# Altium footprint library chipfc_extras_footprint.PCBLIB: 89 footprints (part 5 of 6)
Each footprint in its own frame and in the unit in brackets; x right, y up, seen from the top. Pads: shape width x height; smd on the part's side, far side on the other; paste and mask are expansions set on the pad; w line width, h text height; cw(c..) or ccw(c..) is an arc to the next point about the centre after c.
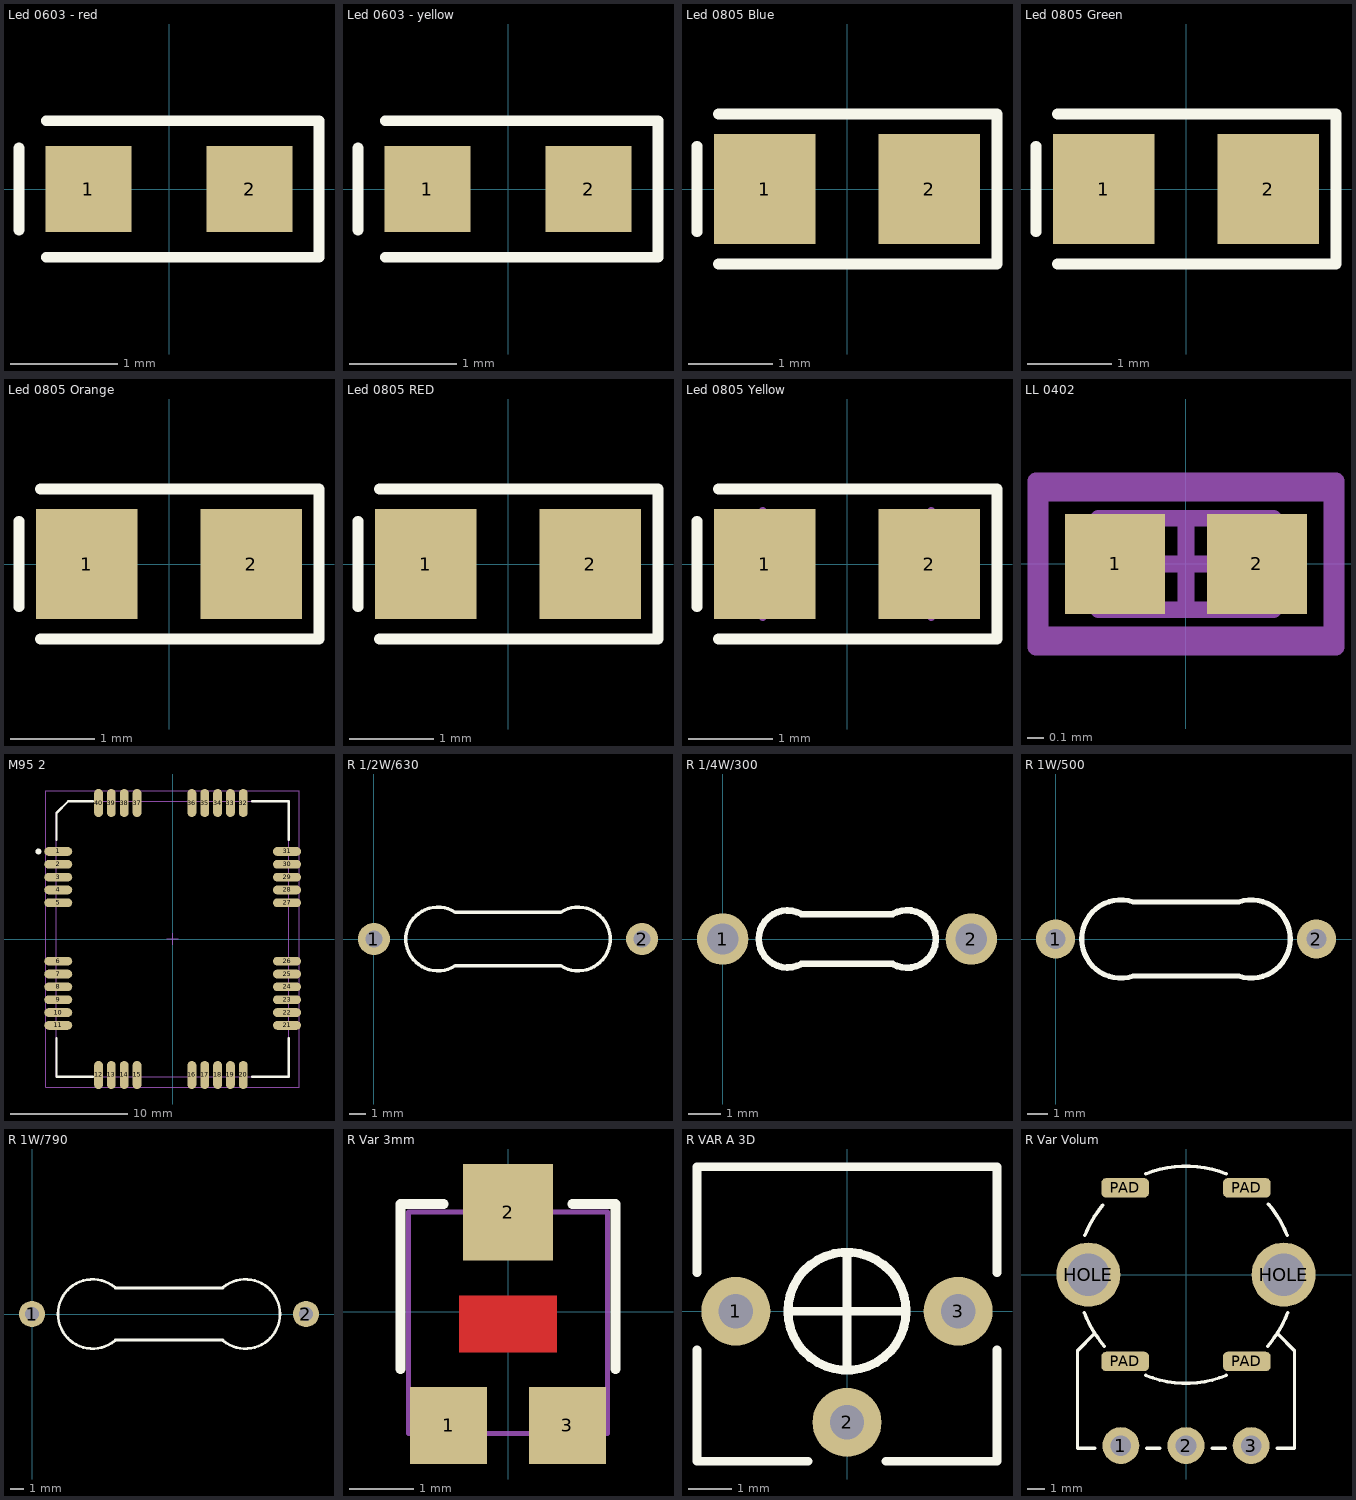
[diagram p4: the footprints below, top view; thin cyan lines are the x and y axes]

## Led 0603 - red [mm] "Led SMD 0603"
height 0.8
pads (2):
  rect 0.8x0.8 smd: 1(-0.75,0) 2(0.75,0)
Top Overlay:
  lines w0.1: -1.397,-0.381 -1.397,0.381 ; -1.143,-0.635 1.397,-0.635 1.397,0.635 -1.143,0.635
3D body "User Library-led_0603-red.step": height 0.6, standoff 0, extent -0.81,-0.4 0.81,0.4

## Led 0603 - yellow [mm] "Led SMD 0603"
height 0.8
pads (2):
  rect 0.8x0.8 smd: 1(-0.75,0) 2(0.75,0)
Top Overlay:
  lines w0.1: -1.397,-0.381 -1.397,0.381 ; -1.143,-0.635 1.397,-0.635 1.397,0.635 -1.143,0.635
3D body "User Library-led_0603-yellow.step": height 0.6, standoff 0, extent -0.81,-0.4 0.81,0.4

## Led 0805 Blue [mm] "Led SMD 0805"
height 1.1
pads (2):
  rect 1.2x1.3 smd: 1(-0.975,0) 2(0.975,0)
Top Overlay:
  lines w0.127: -1.778,-0.508 -1.778,0.508 ; -1.524,-0.889 1.778,-0.889 1.778,0.889 -1.524,0.889
3D body "User Library-led_0805-blue.step": height 1.1, standoff 0, extent -1.01,-0.625 1.01,0.625

## Led 0805 Green [mm] "Led SMD 0805"
height 1.1
pads (2):
  rect 1.2x1.3 smd: 1(-0.975,0) 2(0.975,0)
Top Overlay:
  lines w0.127: -1.778,-0.508 -1.778,0.508 ; -1.524,-0.889 1.778,-0.889 1.778,0.889 -1.524,0.889
3D body "User Library-led_0805-green.step": height 1.1, standoff 0, extent -1.01,-0.625 1.01,0.625

## Led 0805 Orange [mm] "Led SMD 0805"
height 1.1
pads (2):
  rect 1.2x1.3 smd: 1(-0.975,0) 2(0.975,0)
Top Overlay:
  lines w0.127: -1.778,-0.508 -1.778,0.508 ; -1.524,-0.889 1.778,-0.889 1.778,0.889 -1.524,0.889
3D body "User Library-led_0805-orange.step": height 1.1, standoff 0, extent -1.01,-0.625 1.01,0.625

## Led 0805 RED [mm] "Led SMD 0805"
height 1.1
pads (2):
  rect 1.2x1.3 smd: 1(-0.975,0) 2(0.975,0)
Top Overlay:
  lines w0.127: -1.778,-0.508 -1.778,0.508 ; -1.524,-0.889 1.778,-0.889 1.778,0.889 -1.524,0.889
3D body "User Library-led_0805-red.step": height 1.1, standoff 0, extent -1.01,-0.625 1.01,0.625

## Led 0805 Yellow [mm] "Led SMD 0805"
height 1.1
pads (2):
  rect 1.2x1.3 smd: 1(-0.975,0) 2(0.975,0)
Top Overlay:
  lines w0.127: -1.778,-0.508 -1.778,0.508 ; -1.524,-0.889 1.778,-0.889 1.778,0.889 -1.524,0.889
Mechanical 13:
  rectangle: -1,-0.625 -0.731,0.625
  lines w0.1: -1,-0.625 -1,0.625 ; 1,-0.625 1,0.625
3D body "User Library-led_0805.step": height 1.1, standoff 0, extent -1.01,-0.625 1.01,0.625

## LL 0402 [mm] "Chip Capacitor, 2-Leads, Body 1.0x0.5mm, IPC Medium Density"
height 0.55
pads (2):
  rect 0.6x0.6 smd: 1(-0.425,0) 2(0.425,0)
Mechanical 13:
  lines w0.1: -0.525,-0.275 -0.525,0.275 0.525,0.275 0.525,-0.275 -0.525,-0.275
Mechanical 15:
  lines w0.1: -0.275,0 0.275,0 ; 0,-0.275 0,0.275 ; -0.875,-0.425 -0.875,0.425 0.875,0.425 0.875,-0.425 -0.875,-0.425
Mechanical 31:
  lines w0.1: -0.9,-0.5 -0.9,0.5 0.9,0.5 0.9,-0.5 -0.9,-0.5
3D body "User Library-Chip Inductor-L0402 (1005).step": height 0.5, standoff 0, extent -0.5,-0.3 0.5,0.3

## M95 2 [mm] "LCC, 54-Pins, Body 19.9x23.6mm (max), Pitch 1.10mm, IPC Medium Density"
height 2.65
pads (40):
  oval 2.4x0.75 smd: 1(-9.8,7.5) 2(-9.8,6.4) 3(-9.8,5.3) 4(-9.8,4.2) 5(-9.8,3.1) 6(-9.8,-1.9) 7(-9.8,-3) 8(-9.8,-4.1) 9(-9.8,-5.2) 10(-9.8,-6.3) 11(-9.8,-7.4) 21(9.8,-7.4) 22(9.8,-6.3) 23(9.8,-5.2) 24(9.8,-4.1) 25(9.8,-3) 26(9.8,-1.9) 27(9.8,3.1) 28(9.8,4.2) 29(9.8,5.3) 30(9.8,6.4) 31(9.8,7.5)
  oval 0.75x2.4 smd: 12(-6.35,-11.65) 13(-5.25,-11.65) 14(-4.15,-11.65) 15(-3.05,-11.65) 16(1.65,-11.65) 17(2.75,-11.65) 18(3.85,-11.65) 19(4.95,-11.65) 20(6.05,-11.65) 32(6.05,11.65) 33(4.95,11.65) 34(3.85,11.65) 35(2.75,11.65) 36(1.65,11.65) 37(-3.05,11.65) 38(-4.15,11.65) 39(-5.25,11.65) 40(-6.35,11.65)
Top Overlay:
  circle w0.25: c-11.5,7.5 r0.125
  lines w0.2: -9.95,-8.475 -9.95,-11.8 -6.825,-11.8 ; -9.95,8.475 -9.95,10.8 -8.95,11.8 -6.825,11.8 ; 6.825,-11.8 9.95,-11.8 9.95,-8.475 ; 6.825,11.8 9.95,11.8 9.95,8.475
Mechanical 13:
  lines w0.1: -9.95,-11.8 9.95,-11.8 9.95,11.8 -8.95,11.8 -9.95,10.8 -9.95,-11.8
Mechanical 15:
  lines w0.1: -0.5,0 0.5,0 ; 0,-0.5 0,0.5 ; -10.85,-12.7 10.85,-12.7 10.85,12.7 -10.85,12.7 -10.85,-12.7
3D body "User Library-Quectel M95.step": height 2.66, standoff 0, extent -10,-11.8 9.9,11.8

## R 1/2W/630 [mil] "Through hole resitor, axial 600mils, 1W"
pads (2):
  round 75 / inner round 60 / far side round 80 hole 39: 1(0,0) 2(630,0)
Top Overlay:
  lines w8: 191.6,-62.4 cw(c150,0) 191.6,62.4 438.4,62.4 cw(c480,0) 438.4,-62.4 191.6,-62.4
3D body "User Library-Resistor 1W_ok.STEP": height 153.72, standoff -196.7, extent -15,-73.85 644.84,73.85

## R 1/4W/300 [mil] "Through hole resitor, axial 300mils, 1/4W"
pads (2):
  round 62 hole 38: 1(0,0) 2(300,0)
Top Overlay:
  lines w8: 95,-30 cw(c78.05,0) 95,30 205,30 cw(c222.5,0) 205,-30 95,-30
3D body "User Library-R-Axial-0_25W-7_62.step": height 97.42, standoff -146.85, extent -11.8,-47.37 311.82,47.38

## R 1W/500 [mil] "Through hole resitor, axial 500mils, 1W"
pads (2):
  round 75 / inner round 60 / far side round 80 hole 39: 1(0,0) 2(500,0)
Top Overlay:
  lines w10: 148.72,-71.15 cw(c125,0) 148.72,71.15 351.28,71.15 cw(c375,0) 351.28,-71.15 148.72,-71.15
3D body "User Library-Res50 1W SilCoat.step": height 177.95, standoff -78.74, extent -14.76,-88.58 514.77,88.58

## R 1W/790 [mil] "Through hole resitor, axial 600mils, 1W"
pads (2):
  round 75 / inner round 60 / far side round 80 hole 39: 1(0,0) 2(790,0)
Top Overlay:
  lines w8: 239.02,-76.82 cw(c175,0) 239.02,76.82 ; 240,-75 550.98,-75 ; 240,75 550.98,75 ; 550.98,-76.82 ccw(c615,0) 550.98,76.82
3D body "User Library-res_20x20.STEP": height 198.43, standoff -85.04, extent -13.9,-98.43 805,98.43

## R Var 3mm [mm]
pads (3):
  rect 1.2x1.2 smd: 1(-0.925,-1.775) 3(0.925,-1.775)
  rect 1.4x1.5 smd: 2(0,1.55)
Top Layer:
  rectangle: -0.762,-0.635 0.762,0.254
Top Overlay:
  lines w0.152: -1.675,-0.9 -1.675,1.675 -1,1.675 ; 1,1.675 1.675,1.675 1.675,-0.9
Mechanical 15:
  lines w0.076: -1.55,-1.9 -1.55,1.55 1.55,1.55 1.55,-1.9 -1.55,-1.9 ; -1.4,-1.9 -1.4,-1.3 -0.45,-1.3 -0.45,-1.9 -1.4,-1.9 ; -0.6,0.9 -0.6,1.85 0.6,1.85 0.6,0.9 -0.6,0.9 ; 0.45,-1.9 0.45,-1.3 1.4,-1.3 1.4,-1.9 0.45,-1.9
3D body "User Library-PVZ3A.STEP": height 1.95, standoff 0, extent -1.55,-1.85 1.55,1.84

## R VAR A 3D [mil]
pads (3):
  round 62 hole 31: 1(-100,0) 2(0,-100) 3(100,0)
Top Overlay:
  circle w8: c0,0 r53.15
  lines w8: -135,-35 -135,-135 -35,-135 ; -135,35 -135,130 135,130 135,35 ; -50,0 50,0 ; 0,-50 0,50 ; 35,-135 135,-135 135,-35
3D body "User Library-Bien_tro_xanh_ResPVC6a.step": height 204.72, standoff -118.11, extent -135.83,-136.17 135.83,136.23

## R Var Volum [mil]
pads (9):
  round 85 hole 47.24: 1(-150,-393.7) 2(0,-393.7) 3(150,-393.7)
  round 147.64 hole 98.43: HOLE(-225,0) HOLE(225,0)
  rrect50% 110x45 smd: PAD(-140,-200) PAD(-140,200) PAD(140,-200) PAD(140,200)
Top Overlay:
  lines w8: -234.08,-87.78 ccw(c0,0) -188.14,-164.63 ; -232.81,91.1 cw(c0,0) -192.06,160.05 ; -212.5,-137.5 -250,-175 -250,-400 -210,-400 ; -92.85,-232.12 ccw(c0,0) 92.85,-232.12 ; -92.85,232.12 cw(c0,0) 92.85,232.12 ; -90,-400 -60,-400 ; 60,-400 90,-400 ; 188.14,-164.63 ccw(c0,0) 234.08,-87.78 ; 189.81,162.7 cw(c0,0) 232.81,91.1 ; 210,-400 250,-400 250,-175 212.5,-137.5